# Altium footprint library Herry.PcbLib: 58 footprints (part 2 of 4)
Each footprint in its own frame and in the unit in brackets; x right, y up, seen from the top. Pads: shape width x height; smd on the part's side, far side on the other; paste and mask are expansions set on the pad; w line width, h text height; cw(c..) or ccw(c..) is an arc to the next point about the centre after c.
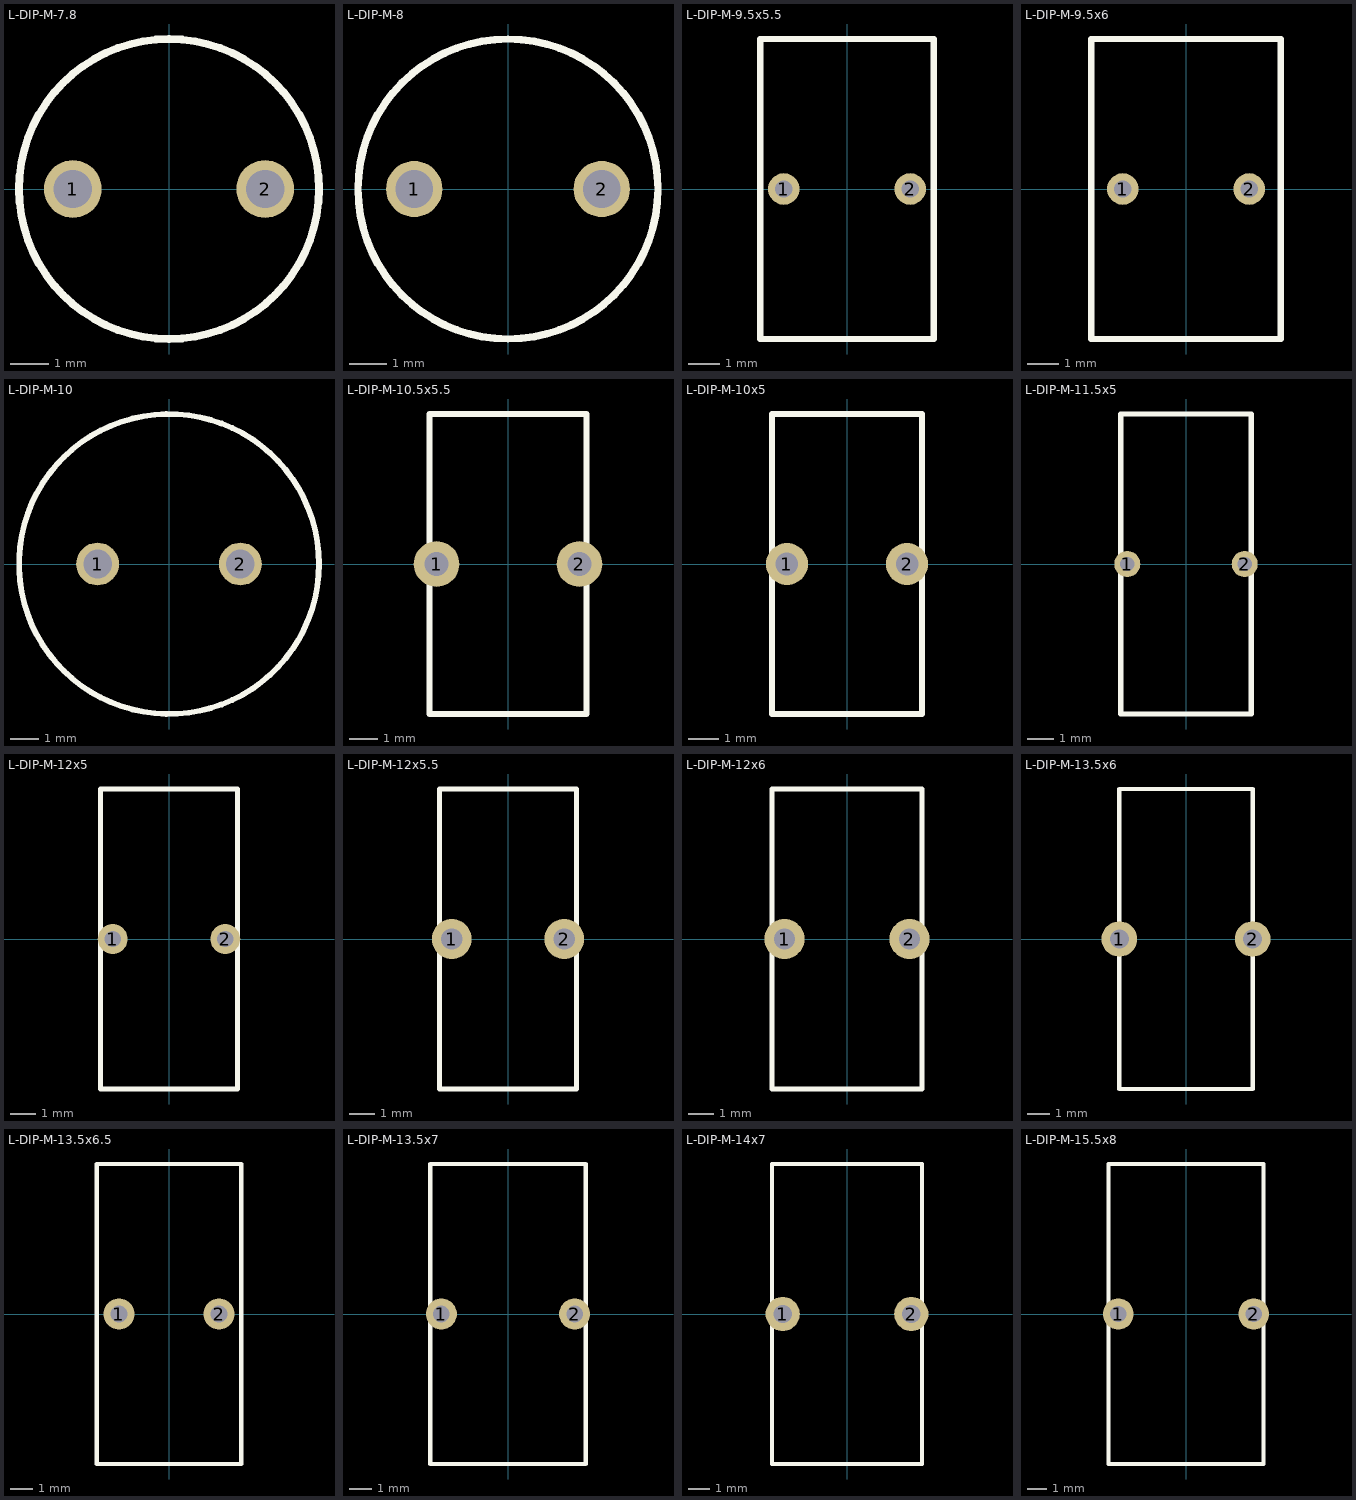
[diagram p1: the footprints below, top view; thin cyan lines are the x and y axes]

## L-DIP-M-7.8 [mm] "THT Inductor, 2-Leads, Body 7,8  mm"
height 9.5
pads (2):
  round 1.5 hole 1: 1(-2.5,0) 2(2.5,0)
Top Overlay:
  circle w0.2: c0,0 r3.9
Mechanical 1:
  circle w0.1: c0,0 r3.9
3D body "744772471.stp": height 9.5, standoff -5, extent -3.9,-3.9 3.886,3.895

## L-DIP-M-8 [mm] "THT Inductor, 2-Leads, Body 8,0  mm"
height 12.5
pads (2):
  round 1.5 hole 1: 1(-2.5,0) 2(2.5,0)
Top Overlay:
  circle w0.2: c0,0 r4
Mechanical 1:
  circle w0.1: c0,0 r4
3D body "744743101.stp": height 12.51, standoff -4.99, extent -3.965,-3.956 3.965,3.975

## L-DIP-M-9.5x5.5 [mm] "Body 9.5x5.5mm, 2 leads"
height 9.5
pads (2):
  round 1 hole 0.55: 1(-2,0) 2(2,0)
Top Overlay:
  lines w0.2: -2.75,-4.75 2.75,-4.75 2.75,4.75 -2.75,4.75 -2.75,-4.75
3D body "7447051.stp": height 10.07, standoff -14.75, extent -2.57,-5.049 2.57,5.049

## L-DIP-M-9.5x6 [mm] "Body 9.5x6mm, 2 leads"
height 9.5
pads (2):
  round 1 hole 0.55: 1(-2,0) 2(2,0)
Top Overlay:
  lines w0.2: -3,-4.75 -3,4.75 3,4.75 3,-4.75 -3,-4.75
3D body "7447050.stp": height 9.75, standoff -14.4, extent -2.85,-4.749 2.85,4.749

## L-DIP-M-10 [mm] "THT Inductor, 2-Leads, Body 10,0  mm"
height 14.5
pads (2):
  round 1.5 hole 1: 1(-2.5,0) 2(2.5,0)
Top Overlay:
  circle w0.2: c0,0 r5.25
Mechanical 1:
  circle w0.1: c0,0 r5.25
3D body "744748xxxx.stp": height 14.1, standoff -3.45, extent -4.983,-4.968 4.983,4.969

## L-DIP-M-10.5x5.5 [mm] "Body 10.5x5.5mm, 2 leads"
height 10.5
pads (2):
  round 1.6 hole 0.85: 1(-2.5,0) 2(2.5,0)
Top Overlay:
  lines w0.2: -2.75,-5.25 2.75,-5.25 2.75,5.25 -2.75,5.25 -2.75,-5.25
3D body "7447054.stp": height 11.72, standoff -14.35, extent -3.371,-5.857 3.37,5.857

## L-DIP-M-10x5 [mm] "Body 10x5mm, 2 leads"
height 10
pads (2):
  round 1.4 hole 0.75: 1(-2,0) 2(2,0)
Top Overlay:
  lines w0.2: -2.5,-5 -2.5,5 2.5,5 2.5,-5 -2.5,-5
3D body "7447053.stp": height 10.99, standoff -14.5, extent -3.01,-5.503 3.01,5.502

## L-DIP-M-11.5x5 [mm] "Body 11.5x5mm, 2 leads"
height 11.5
pads (2):
  round 1 hole 0.55: 1(-2.25,0) 2(2.25,0)
Top Overlay:
  lines w0.2: -2.5,-5.75 -2.5,5.75 2.5,5.75 2.5,-5.75 -2.5,-5.75
3D body "7447040.stp": height 12.31, standoff -14.5, extent -2.821,-6.066 2.821,6.067

## L-DIP-M-12x5 [mm] "Body 12x5.5mm, 2 leads"
height 12
pads (2):
  round 1.2 hole 0.65: 1(-2.25,0) 2(2.25,0)
Top Overlay:
  lines w0.2: -2.75,-6 2.75,-6 2.75,6 -2.75,6 -2.75,-6
3D body "7447041.stp": height 12.89, standoff -14.5, extent -3.17,-6.411 3.17,6.412

## L-DIP-M-12x5.5 [mm] "Body 12x5.5mm, 2 leads"
height 12
pads (2):
  round 1.6 hole 0.85: 1(-2.25,0) 2(2.25,0)
Top Overlay:
  lines w0.2: -2.75,-6 -2.75,6 2.75,6 2.75,-6 -2.75,-6
3D body "7447045.stp": height 13.62, standoff -14, extent -3.37,-6.618 3.37,6.62

## L-DIP-M-12x6 [mm] "Body 12x6mm, 2 leads"
height 12
pads (2):
  round 1.6 hole 0.85: 1(-2.5,0) 2(2.5,0)
Top Overlay:
  lines w0.2: -3,-6 -3,6 3,6 3,-6 -3,-6
3D body "7447044.stp": height 13.56, standoff -14, extent -3.62,-6.604 3.62,6.605

## L-DIP-M-13.5x6 [mm] "Body 13.5x6mm, 2 leads"
height 13.5
pads (2):
  round 1.6 hole 0.85: 1(-3,0) 2(3,0)
Top Overlay:
  lines w0.2: -3,-6.75 -3,6.75 3,6.75 3,-6.75 -3,-6.75
3D body "7447035.stp": height 14.8, standoff -14.25, extent -3.62,-7.352 3.62,7.351

## L-DIP-M-13.5x6.5 [mm] "Body 13.5x6.5mm, 2 leads"
height 13.5
pads (2):
  round 1.4 hole 0.75: 1(-2.25,0) 2(2.25,0)
Top Overlay:
  lines w0.2: -3.25,-6.75 -3.25,6.75 3.25,6.75 3.25,-6.75 -3.25,-6.75
3D body "7447034.stp": height 14.49, standoff -14, extent -3.76,-7.004 3.76,7.003

## L-DIP-M-13.5x7 [mm] "Body 13.5x7mm, 2 leads"
height 13.5
pads (2):
  round 1.4 hole 0.75: 1(-3,0) 2(3,0)
Top Overlay:
  lines w0.2: -3.5,-6.75 3.5,-6.75 3.5,6.75 -3.5,6.75 -3.5,-6.75
3D body "7447031.stp": height 14.74, standoff -14.25, extent -4.01,-7.254 4.01,7.253

## L-DIP-M-14x7 [mm] "Body 14x7mm, 2 leads"
height 14
pads (2):
  round 1.6 hole 0.85: 1(-3,0) 2(3,0)
Top Overlay:
  lines w0.2: -3.5,-7 3.5,-7 3.5,7 -3.5,7 -3.5,-7
3D body "7447033.stp": height 15.6, standoff -14, extent -4.12,-7.613 4.12,7.614

## L-DIP-M-15.5x8 [mm] "Body 15.5x8mm, 2 leads"
height 15.5
pads (2):
  round 1.6 hole 0.85: 1(-3.5,0) 2(3.5,0)
Top Overlay:
  lines w0.2: -4,-7.75 -4,7.75 4,7.75 4,-7.75 -4,-7.75
3D body "7447021.stp": height 16.84, standoff -14.25, extent -4.62,-8.363 4.62,8.362